# Altium footprint library CD's_LIB_2018.PcbLib: 155 footprints (part 5 of 10)
Each footprint in its own frame and in the unit in brackets; x right, y up, seen from the top. Pads: shape width x height; smd on the part's side, far side on the other; paste and mask are expansions set on the pad; w line width, h text height; cw(c..) or ccw(c..) is an arc to the next point about the centre after c.
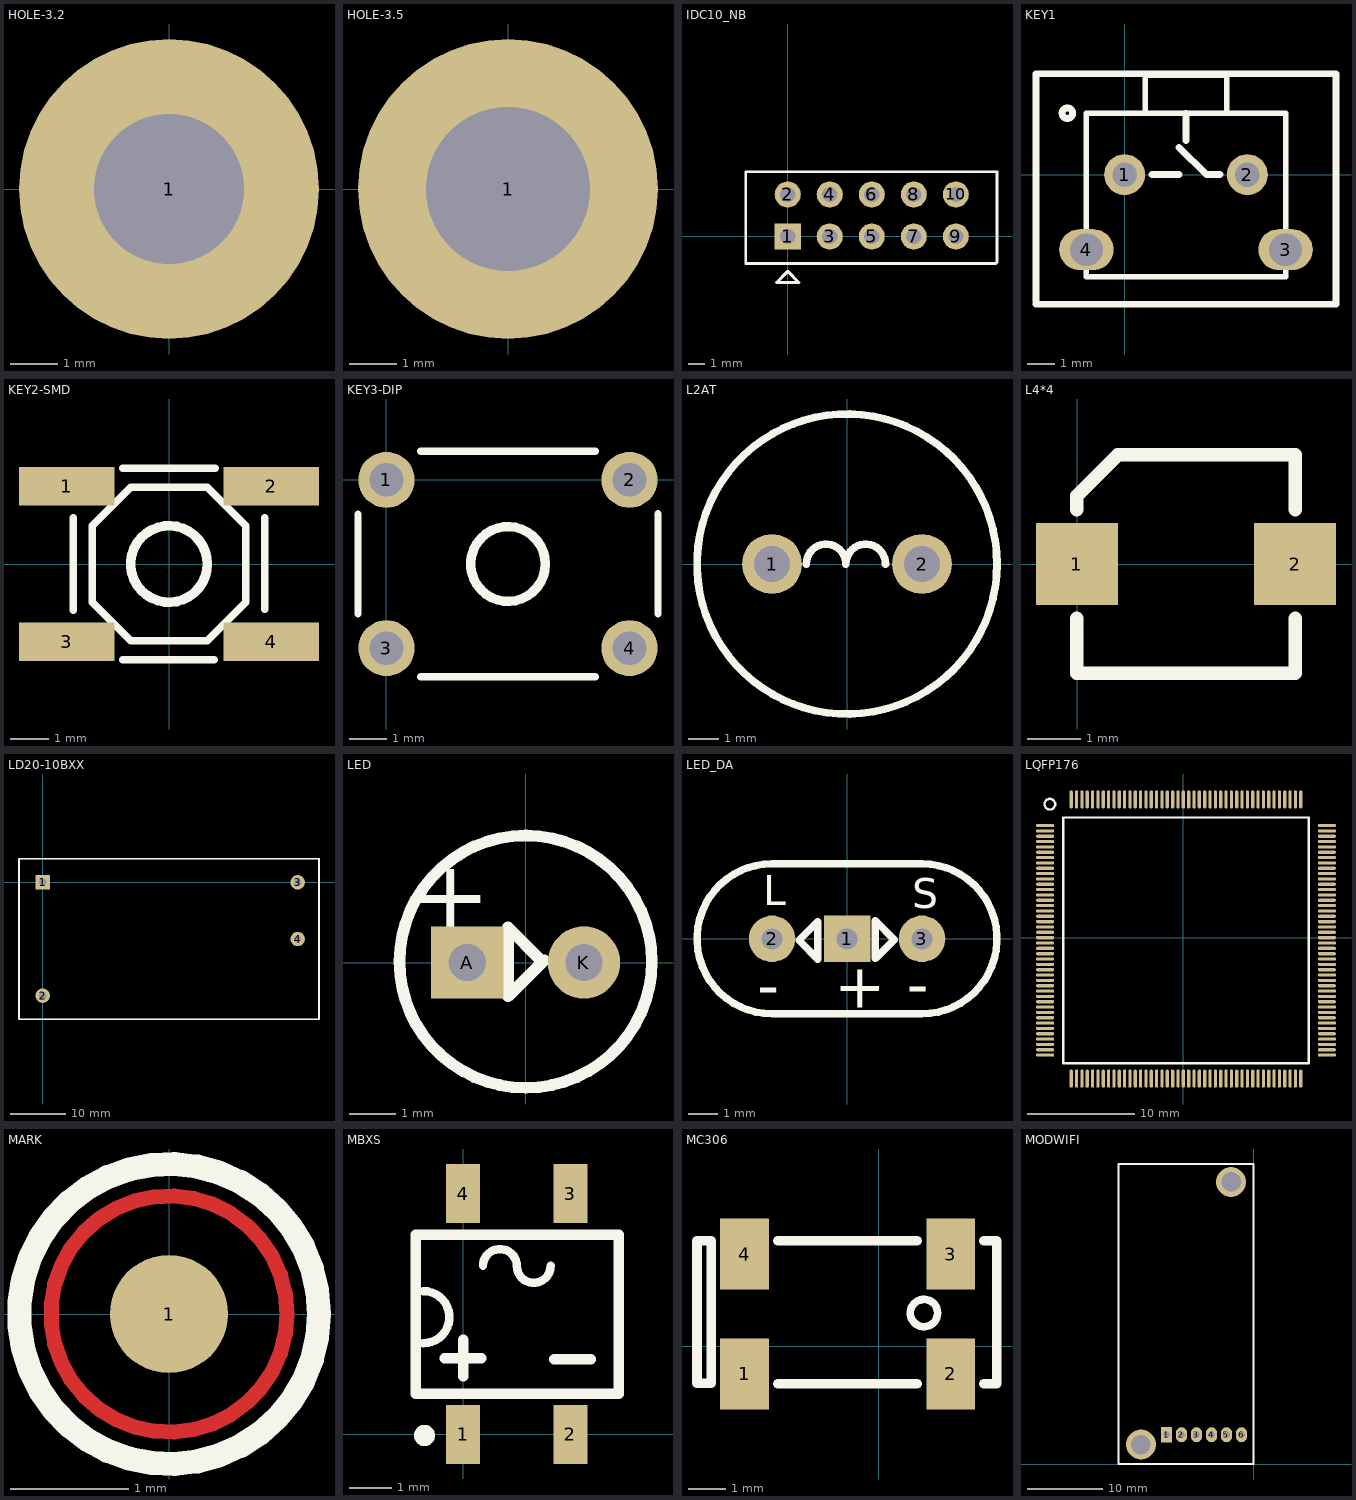
[diagram p4: the footprints below, top view; thin cyan lines are the x and y axes]

## HOLE-3.2 [mm] "孔径3.2mm"
pads (1):
  round 6.4 hole 3.2: 1(0,0)

## HOLE-3.5 [mm] "孔径3.5mm"
pads (1):
  round 6.4 hole 3.5: 1(0,0)

## IDC10_NB [mil]
pads (10):
  rect 62x62 hole 36: 1(0,0)
  round 62 hole 36: 2(0,100) 3(100,0) 4(100,100) 5(200,0) 6(200,100) 7(300,0) 8(300,100) 9(400,0) 10(400,100)
Top Overlay:
  lines w7: 496,-64 -50,-64 -100,-64 -100,154 498,154 498,-62 ; -27,-110 0,-83 27,-110 18,-110 -27,-110

## KEY1 [mm]
pads (4):
  round 1.5 hole 0.9: 1(0,0) 2(4.5,0)
  oval 2x1.5 hole 1.2: 3(5.9,-2.75) 4(-1.4,-2.75)
Top Overlay:
  circle w0.254: c-2.101,2.254 r0.193
  lines w0.2: 0.75,2.25 0.75,3.65 3.75,3.65 3.75,2.25 ; -1.4,-3.75 -1.4,2.25 5.9,2.25 5.9,-3.75 -1.4,-3.75
  lines w0.254: -3.25,-4.752 7.75,-4.752 7.75,3.7 -3.25,3.7 -3.25,-4.653 ; 1,0 2,0 ; 2,1 3,0 3.5,0 ; 2.25,1.25 2.25,2.25
3D body: height 7, standoff -4, extent -1.45,-4.244 5.95,3.056

## KEY2-SMD [mm] "贴片按键 5*5"
pads (4):
  rect 2.5x1 smd: 1(-2.667,2.032) 2(2.667,2.032) 3(-2.667,-2.032) 4(2.667,-2.032)
Top Overlay:
  circle w0.254: c0,0 r1
  lines w0.2: -2.5,-1.208 -2.5,1.208 ; -1.208,-2.5 1.183,-2.5 ; -1.208,2.5 1.208,2.5 ; 2.5,-1.183 2.5,1.208 ; -2,-1 -2,1 -1,2 1,2 2,1 2,-1 1,-2 -1,-2 -2,-1
3D body: height 1.5, standoff 0, extent -3.2,-2.7 3.2,2.6

## KEY3-DIP [mm] "按键 6*6"
pads (4):
  round 1.5 hole 0.9 unplated: 1(0,0) 2(6.5,0) 3(0,-4.5) 4(6.5,-4.5)
Top Overlay:
  circle w0.254: c3.25,-2.25 r1
  lines w0.2: -0.762,-3.581 -0.762,-0.914 ; 0.914,0.762 5.588,0.762 ; 0.919,-5.262 5.584,-5.262 ; 7.262,-3.584 7.262,-0.912

## L2AT [mm]
pads (2):
  round 2 hole 1.2: 1(-2.5,0) 2(2.5,0)
Top Overlay:
  circle w0.254: c0,0 r5
  lines w0.254: -1.357,0 cw(c-0.697,0) -0.036,0 cw(c0.624,0) 1.285,0

## L4*4 [mil]
pads (2):
  rect 60x60 smd: 1(-0.28,0.11) 2(159.72,0.11)
Top Overlay:
  lines w10: -0.28,-39.89 -0.28,-49.89 -0.28,-79.89 159.72,-79.89 159.72,-49.89 159.72,-39.89 ; -0.28,40.11 -0.28,50.11 29.72,80.11 159.72,80.11 159.72,50.11 159.72,40.11

## LD20-10BXX [mm] "AC-DC模块"
pads (4):
  rect 2.6x2.6 hole 1.3: 1(0,0)
  round 2.6 hole 1.3: 2(0,-20.32) 3(45.72,0) 4(45.72,-10.16)
Top Overlay:
  lines w0.3: -4.24,-24.56 49.56,-24.56 49.56,4.24 -4.24,4.24 -4.24,-24.56

## LED [mil]
pads (2):
  rect 62x62 hole 32: A(-50,0)
  round 62 hole 32: K(50,0)
Top Overlay:
  circle w10: c0.1,0.7 r108
  lines w10: 108.1,0.7 ccw(c-0.9,0.7) 108.1,1.7 ; -15,-29 -15,30 13,2 16,2 -15,-29
  text "+" at -30,80 h60
3D body: height 417.32, standoff -19.68, extent -78.52,-78.75 65.61,78.73
3D body: height 236.22, standoff 0, extent -78.62,-78.71 78.74,78.71

## LED_DA [mil]
pads (3):
  rect 62x62 hole 28: 1(0,0)
  round 62 hole 28: 2(-100,0) 3(100,0)
Top Overlay:
  lines w10: -40,22 -64,-2 -39,-27 -39,23 ; 38,-26 38,24 63,-1 39,-25 ; -100,-100 cw(c-100,0) -100,100 100,100 cw(c100,0) 100,-100 -100,-100
  text "-" at 80,-90 h60
  text "-" at -120,-91 h60
  text "+" at -17,-92 h60
  text "S" at 87,41 h40
  text "L" at -112,45 h40
3D body: height 590.7, standoff -46.3, extent -110,-78.24 110,78.25
3D body: height 295.28, standoff 0, extent -29.33,-78.7 128,78.7

## LQFP176 [mm]
pads (176):
  oval 1.7x0.3 smd: 1(-12.95,10.5) 2(-12.95,10) 3(-12.95,9.5) 4(-12.95,9) 5(-12.95,8.5) 6(-12.95,8) 7(-12.95,7.5) 8(-12.95,7) 9(-12.95,6.5) 10(-12.95,6) 11(-12.95,5.5) 12(-12.95,5) 13(-12.95,4.5) 14(-12.95,4) 15(-12.95,3.5) 16(-12.95,3) 17(-12.95,2.5) 18(-12.95,2) 19(-12.95,1.5) 20(-12.95,1) 21(-12.95,0.5) 22(-12.95,0) 23(-12.95,-0.5) 24(-12.95,-1) 25(-12.95,-1.5) 26(-12.95,-2) 27(-12.95,-2.5) 28(-12.95,-3) 29(-12.95,-3.5) 30(-12.95,-4) 31(-12.95,-4.5) 32(-12.95,-5) 33(-12.95,-5.5) 34(-12.95,-6) 35(-12.95,-6.5) 36(-12.95,-7) 37(-12.95,-7.5) 38(-12.95,-8) 39(-12.95,-8.5) 40(-12.95,-9) 41(-12.95,-9.5) 42(-12.95,-10) 43(-12.95,-10.5) 44(-12.95,-11) 89(13.45,-11) 90(13.45,-10.5) 91(13.45,-10) 92(13.45,-9.5) 93(13.45,-9) 94(13.45,-8.5) 95(13.45,-8) 96(13.45,-7.5) 97(13.45,-7) 98(13.45,-6.5) 99(13.45,-6) 100(13.45,-5.5) 101(13.45,-5) 102(13.45,-4.5) 103(13.45,-4) 104(13.45,-3.5) 105(13.45,-3) 106(13.45,-2.5) 107(13.45,-2) 108(13.45,-1.5) 109(13.45,-1) 110(13.45,-0.5) 111(13.45,0) 112(13.45,0.5) 113(13.45,1) 114(13.45,1.5) 115(13.45,2) 116(13.45,2.5) 117(13.45,3) 118(13.45,3.5) 119(13.45,4) 120(13.45,4.5) 121(13.45,5) 122(13.45,5.5) 123(13.45,6) 124(13.45,6.5) 125(13.45,7) 126(13.45,7.5) 127(13.45,8) 128(13.45,8.5) 129(13.45,9) 130(13.45,9.5) 131(13.45,10) 132(13.45,10.5)
  oval 0.3x1.7 smd: 45(-10.5,-13.2) 46(-10,-13.2) 47(-9.5,-13.2) 48(-9,-13.2) 49(-8.5,-13.2) 50(-8,-13.2) 51(-7.5,-13.2) 52(-7,-13.2) 53(-6.5,-13.2) 54(-6,-13.2) 55(-5.5,-13.2) 56(-5,-13.2) 57(-4.5,-13.2) 58(-4,-13.2) 59(-3.5,-13.2) 60(-3,-13.2) 61(-2.5,-13.2) 62(-2,-13.2) 63(-1.5,-13.2) 64(-1,-13.2) 65(-0.5,-13.2) 66(0,-13.2) 67(0.5,-13.2) 68(1,-13.2) 69(1.5,-13.2) 70(2,-13.2) 71(2.5,-13.2) 72(3,-13.2) 73(3.5,-13.2) 74(4,-13.2) 75(4.5,-13.2) 76(5,-13.2) 77(5.5,-13.2) 78(6,-13.2) 79(6.5,-13.2) 80(7,-13.2) 81(7.5,-13.2) 82(8,-13.2) 83(8.5,-13.2) 84(9,-13.2) 85(9.5,-13.2) 86(10,-13.2) 87(10.5,-13.2) 88(11,-13.2) 133(11,12.95) 134(10.5,12.95) 135(10,12.95) 136(9.5,12.95) 137(9,12.95) 138(8.5,12.95) 139(8,12.95) 140(7.5,12.95) 141(7,12.95) 142(6.5,12.95) 143(6,12.95) 144(5.5,12.95) 145(5,12.95) 146(4.5,12.95) 147(4,12.95) 148(3.5,12.95) 149(3,12.95) 150(2.5,12.95) 151(2,12.95) 152(1.5,12.95) 153(1,12.95) 154(0.5,12.95) 155(0,12.95) 156(-0.5,12.95) 157(-1,12.95) 158(-1.5,12.95) 159(-2,12.95) 160(-2.5,12.95) 161(-3,12.95) 162(-3.5,12.95) 163(-4,12.95) 164(-4.5,12.95) 165(-5,12.95) 166(-5.5,12.95) 167(-6,12.95) 168(-6.5,12.95) 169(-7,12.95) 170(-7.5,12.95) 171(-8,12.95) 172(-8.5,12.95) 173(-9,12.95) 174(-9.5,12.95) 175(-10,12.95) 176(-10.5,12.95)
Top Overlay:
  circle w0.22: c-12.5,12.5 r0.5
  lines w0.22: -11.25,-11.75 -11.25,11.25 11.75,11.25 11.75,-11.75 -11.25,-11.75

## MARK [mm]
pads (1):
  round 1 smd mask+0.42: 1(0,0)
Top Layer:
  circle w0.127: c0,0 r1
Top Overlay:
  circle w0.203: c0,0 r1.27

## MBXS [mm] "整流桥"
pads (4):
  rect 0.8x1.4 smd: 1(0,0) 2(2.54,0) 3(2.54,5.7) 4(0,5.7)
Top Overlay:
  circle w0.25: c-0.914,-0.025 r0.125
  lines w0.2: -0.94,2.159 ccw(c-0.94,2.776) -0.94,3.392 ; 0.472,3.988 cw(c0.872,3.988) 1.272,3.988 ccw(c1.672,3.988) 2.072,3.988
  lines w0.25: -0.432,1.803 0.432,1.803 ; 0,1.372 0,2.235 ; 2.159,1.778 3.023,1.778
  lines w0.254: -1.118,0.965 -1.118,4.724 3.683,4.724 3.683,0.965 -1.117,0.965

## MC306 [mm]
pads (4):
  rect 1.3x1.9 smd: 1(-3.581,-0.737) 2(1.919,-0.737) 3(1.919,2.463) 4(-3.581,2.463)
Top Overlay:
  circle w0.203: c1.202,0.889 r0.364
  lines w0.203: -4.851,-0.981 -4.851,2.819 ; 3.15,-0.991 3.15,2.809
  lines w0.254: -2.692,-0.991 1.016,-0.991 ; -2.692,2.819 1.016,2.819 ; 2.794,-0.991 3.149,-0.991 3.149,2.819 2.794,2.819 ; -4.851,-0.981 -4.47,-0.981 -4.47,2.819 -4.851,2.819 -4.851,-0.981

## MODWIFI [mm]
pads (8):
  rect 1.5x2 hole 0.9: 1(-11.609,3.908)
  oval 1.5x2 hole 0.9: 2(-9.609,3.908) 3(-7.609,3.908) 4(-5.609,3.908) 5(-3.609,3.908) 6(-1.609,3.908)
  round 4 hole 2.6: ""(-15.009,2.608) ""(-3.009,37.608)
Top Overlay:
  lines w0.254: -18.009,0.008 -18.009,40.008 -0.009,40.008 -0.009,0.008 -18.009,0.008